# Altium footprint library Other.PcbLib: 104 footprints (part 6 of 7)
Each footprint in its own frame and in the unit in brackets; x right, y up, seen from the top. Pads: shape width x height; smd on the part's side, far side on the other; paste and mask are expansions set on the pad; w line width, h text height; cw(c..) or ccw(c..) is an arc to the next point about the centre after c.
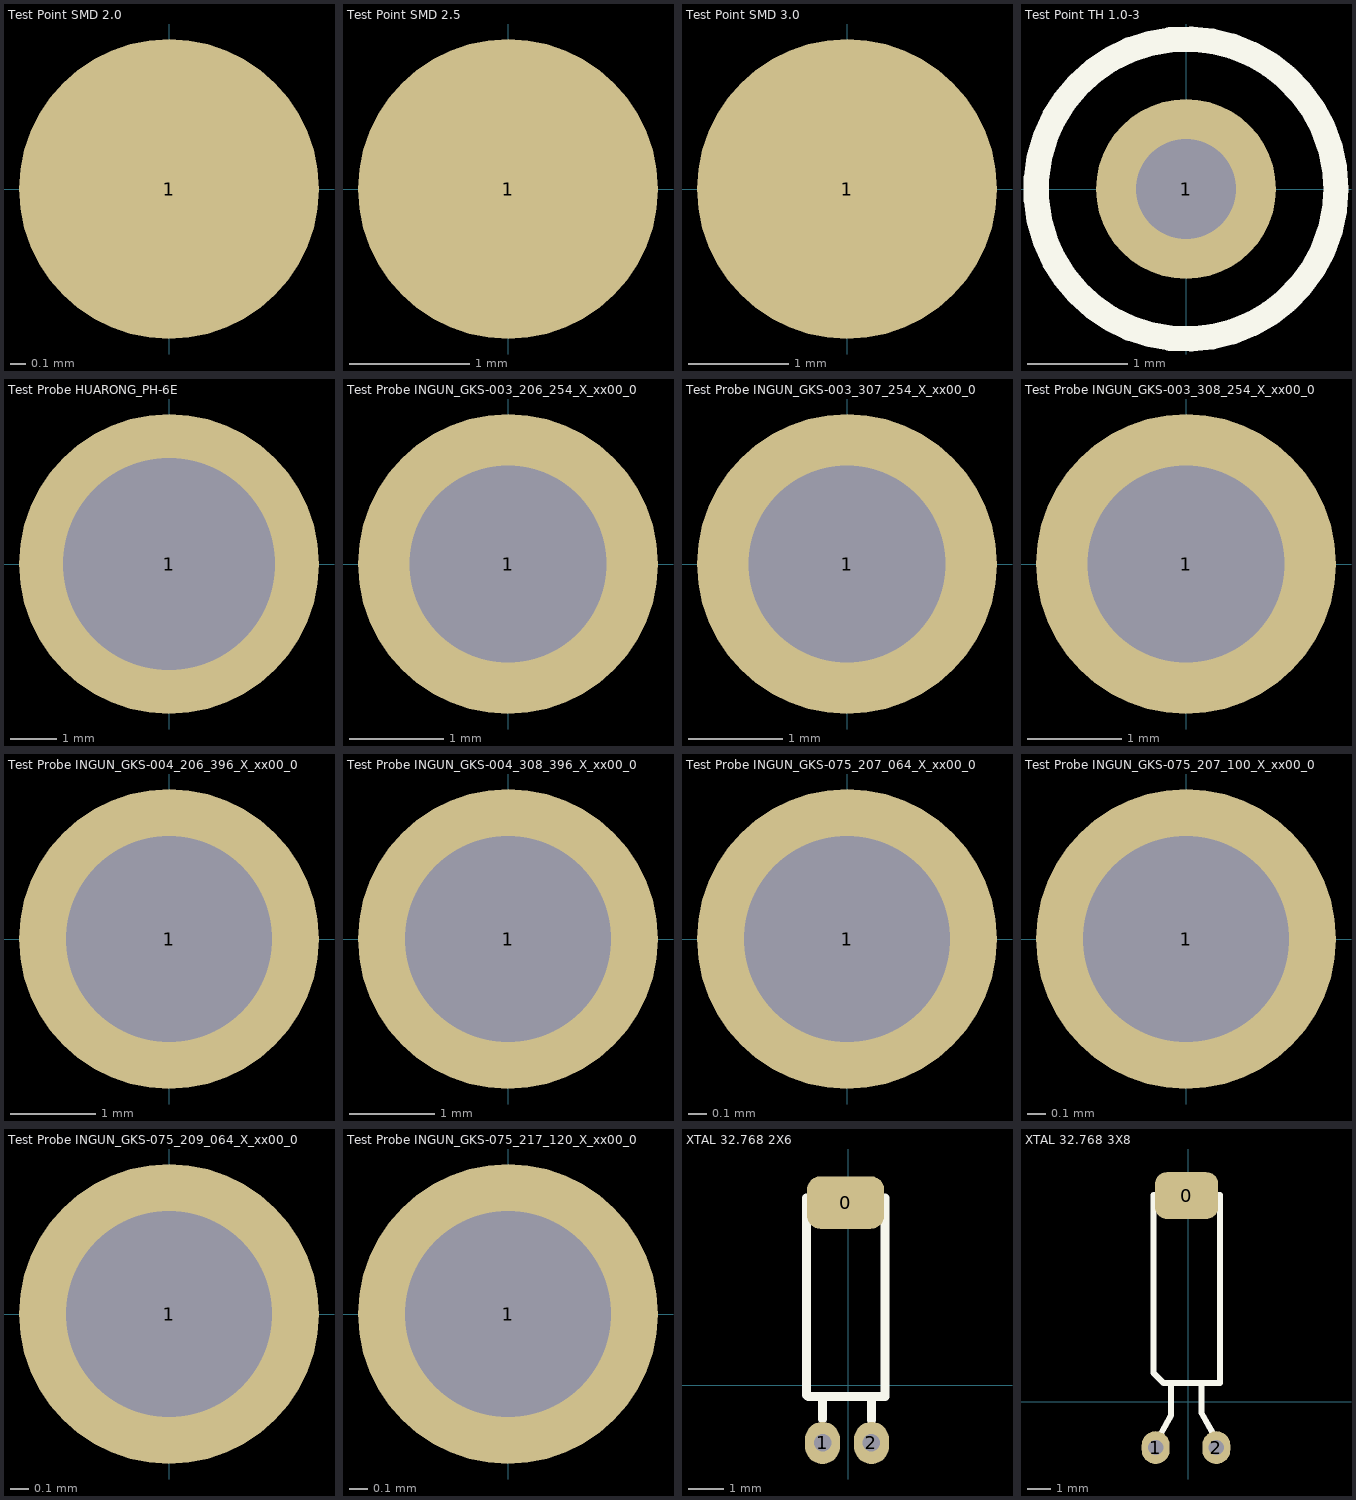
[diagram p5: the footprints below, top view; thin cyan lines are the x and y axes]

## Test Point SMD 2.0 [mm]
pads (1):
  round 2 smd paste-2: 1(0,0)

## Test Point SMD 2.5 [mm]
pads (1):
  round 2.5 smd paste-2: 1(0,0)

## Test Point SMD 3.0 [mm]
pads (1):
  round 3 smd paste-2: 1(0,0)

## Test Point TH 1.0-3 [mm]
pads (1):
  round 1.8 hole 1: 1(0,0)
Top Overlay:
  circle w0.254: c0,0 r1.5

## Test Probe HUARONG_PH-6E [mm]
pads (1):
  round 6.5 hole 4.6: 1(0,0)
3D body "INGUN_GKS-004_308_396_X_xx00_0.STEP": height 3.72, standoff -29.84, extent -1.98,-1.98 1.98,1.98

## Test Probe INGUN_GKS-003_206_254_X_xx00_0 [mm]
pads (1):
  round 3.2 hole 2.1: 1(0,0)
3D body "INGUN_GKS-003_206_254_X_xx00_0.STEP": height 3.49, standoff -29.59, extent -1.27,-1.27 1.27,1.27

## Test Probe INGUN_GKS-003_307_254_X_xx00_0 [mm]
pads (1):
  round 3.2 hole 2.1: 1(0,0)
3D body "INGUN_GKS-003_307_254_X_xx00_0.STEP": height 3.49, standoff -29.55, extent -1.27,-1.27 1.155,1.265

## Test Probe INGUN_GKS-003_308_254_X_xx00_0 [mm]
pads (1):
  round 3.2 hole 2.1: 1(0,0)
3D body "INGUN_GKS-003_308_254_X_xx00_0.STEP": height 3.49, standoff -29.59, extent -1.27,-1.27 1.27,1.27

## Test Probe INGUN_GKS-004_206_396_X_xx00_0 [mm]
pads (1):
  round 3.5 hole 2.4: 1(0,0)
3D body "INGUN_GKS-004_206_396_X_xx00_0.STEP": height 3.72, standoff -29.84, extent -1.98,-1.98 1.98,1.98

## Test Probe INGUN_GKS-004_308_396_X_xx00_0 [mm]
pads (1):
  round 3.5 hole 2.4: 1(0,0)
3D body "INGUN_GKS-004_308_396_X_xx00_0.STEP": height 3.72, standoff -29.84, extent -1.98,-1.98 1.98,1.98

## Test Probe INGUN_GKS-075_207_064_X_xx00_0 [mm]
pads (1):
  round 1.6 hole 1.1: 1(0,0)
3D body "INGUN_GKS-075_207_064_X_xx00_0.STEP": height 3.5, standoff -29.66, extent -0.505,-0.505 0.505,0.505

## Test Probe INGUN_GKS-075_207_100_X_xx00_0 [mm]
pads (1):
  round 1.6 hole 1.1: 1(0,0)
3D body "INGUN_GKS-075_207_100_X_xx00_0.STEP": height 3.44, standoff -29.66, extent -0.505,-0.505 0.505,0.505

## Test Probe INGUN_GKS-075_209_064_X_xx00_0 [mm]
pads (1):
  round 1.6 hole 1.1: 1(0,0)
3D body "INGUN_GKS-075_209_064_X_xx00_0.STEP": height 3.44, standoff -29.66, extent -0.518,-0.518 0.518,0.518

## Test Probe INGUN_GKS-075_217_120_X_xx00_0 [mm]
pads (1):
  round 1.6 hole 1.1: 1(0,0)
3D body "INGUN_GKS-075_217_120_X_xx00_0.STEP": height 3.5, standoff -29.66, extent -0.6,-0.6 0.6,0.6

## XTAL 32.768 2X6 [mm]
pads (3):
  rrect50% 2.2x1.5 smd: 0(-0.076,5.207)
  oval 1x1.2 hole 0.5: 1(-0.737,-1.651) 2(0.66,-1.651)
Top Overlay:
  lines w0.254: -0.737,-0.965 -0.737,-0.406 ; 0.66,-0.991 0.66,-0.356 ; -1.194,-0.279 -1.143,-0.33 1.041,-0.33 1.041,5.334 -1.194,5.334 -1.194,-0.279
3D body "User Library-DT-26-1.step": height 2, standoff -2, extent -1.051,-1.8 0.949,5.34

## XTAL 32.768 3X8 [mm]
pads (3):
  rrect50% 2.7x2 smd: 0(-0.076,8.814)
  oval 1.2x1.4 hole 0.65: 1(-1.397,-1.956) 2(1.194,-1.956)
Top Overlay:
  lines w0.254: -1.168,-1.346 -0.737,-0.559 -0.737,-0.279 -0.737,0.737 ; 0.559,0.686 0.559,-0.33 0.559,-0.483 1.041,-1.332 ; -1.499,1.245 -1.067,0.813 1.346,0.813 1.346,8.839 -1.499,8.839 -1.499,1.245
3D body "User Library-KDS-DT-38.STEP": height 3.1, standoff -2.5, extent -1.626,-2.133 1.374,9.042